# Altium footprint library SOURIAU THD.PcbLib: 34 footprints (part 1 of 5) (continued)
## SOURIAU_EDA-02399-V1-0 [mm] "Adapter Kit For PCB Mount For SOURIAU UTG0187SVDEX, 8 Poles,VDE  Metalok Bantam Circular Female Connecteur" (continued)
Mechanical 14:
  circle w0.1: c13.5,13.5 r2.8
  circle w0.1: c13.5,-13.5 r2.8
  circle w0.1: c-13.5,-13.5 r2.8
  circle w0.1: c-13.5,13.5 r2.8
  circle w0.1: c6.149,-3.55 r1.65
  circle w0.1: c6.149,3.55 r1.65
  circle w0.1: c0,-7.1 r1.65
  circle w0.1: c-6.149,-3.55 r1.65
  circle w0.1: c-6.149,3.55 r1.65
  circle w0.1: c0,7.1 r1.65
  circle w0.1: c0,0 r1.65
  circle w0.1: c0,0 r10.75
  circle w0.1: c0,0 r14.25
  lines w0.1: -14.39,-14.328 cw(c-14.47,-14.06) -14.662,-13.856 ccw(c-14.998,-13.5) -14.662,-13.144 cw(c-14.47,-12.94) -14.39,-12.672 ; -14.39,12.672 cw(c-14.47,12.94) -14.662,13.144 ccw(c-14.998,13.5) -14.662,13.856 cw(c-14.47,14.06) -14.39,14.328 ; -14.39,-14.328 cw(c-14.249,-14.798) -13.772,-14.685 ccw(c-13.5,-14.62) -13.228,-14.685 cw(c-12.751,-14.798) -12.61,-14.328 ccw(c-12.53,-14.06) -12.338,-13.856 cw(c-12.002,-13.5) -12.338,-13.144 ccw(c-12.53,-12.94) -12.61,-12.672 cw(c-12.751,-12.202) -13.228,-12.315 ccw(c-13.5,-12.38) -13.772,-12.315 cw(c-14.249,-12.202) -14.39,-12.672 ; -14.39,12.672 cw(c-14.249,12.202) -13.772,12.315 ccw(c-13.5,12.38) -13.228,12.315 cw(c-12.751,12.202) -12.61,12.672 ccw(c-12.53,12.94) -12.338,13.144 cw(c-12.002,13.5) -12.338,13.856 ccw(c-12.53,14.06) -12.61,14.328 cw(c-12.751,14.798) -13.228,14.685 ccw(c-13.5,14.62) -13.772,14.685 cw(c-14.249,14.798) -14.39,14.328 ; -12.81,6.241 -13.967,6.909 -12.967,8.641 -11.81,7.973 ; -1,-14.215 -1,-15.55 1,-15.55 1,-14.215 ; 11.81,7.973 12.967,8.641 13.967,6.909 12.81,6.241 ; -16.75,-14.75 ccw(c-14.75,-14.75) -14.75,-16.75 14.75,-16.75 ccw(c14.75,-14.75) 16.75,-14.75 16.75,14.75 ccw(c14.75,14.75) 14.75,16.75 -14.75,16.75 ccw(c-14.75,14.75) -16.75,14.75 -16.75,-14.75 ; -12.972,-2.699 ccw(c0,0) -12.584,-4.148 -11.616,-3.889 ccw(c0,0) -8.434,-8.884 -9.078,-9.652 ccw(c0,0) -7.929,-10.616 -7.285,-9.849 ccw(c0,0) 6.399,-10.446 6.973,-11.267 ccw(c0,0) 8.202,-10.406 7.627,-9.586 ccw(c0,0) 12.115,-1.813 13.113,-1.9 ccw(c0,0) 13.244,-0.406 12.246,-0.319 ccw(c0,0) 1.6,12.145 1.6,13.153 ccw(c0,0) -1.6,13.153 -1.6,12.145 ccw(c0,0) -12.005,-2.44 -12.972,-2.699 ; -9.406,-2.371 cw(c0,0) -9.406,2.371 -7.474,1.255 ccw(c-6.149,3.55) -4.824,5.845 -6.756,6.96 cw(c0,0) -2.65,9.331 -2.65,7.1 ccw(c0,7.1) 2.65,7.1 2.65,9.331 cw(c0,0) 6.756,6.96 4.824,5.845 ccw(c6.149,3.55) 7.474,1.255 9.406,2.371 cw(c0,0) 9.406,-2.371 7.474,-1.255 ccw(c6.149,-3.55) 4.824,-5.845 6.756,-6.96 cw(c0,0) 2.65,-9.331 2.65,-7.1 ccw(c0,-7.1) -2.65,-7.1 -2.65,-9.331 cw(c0,0) -6.756,-6.96 -4.824,-5.845 ccw(c-6.149,-3.55) -7.474,-1.255 -9.406,-2.371 ; 0.998,-2.292 ccw(c1.434,-2.048) 1.813,-1.722 ccw(c0,0) 0.998,-2.292 ; 12.338,-13.856 ccw(c12.53,-14.06) 12.61,-14.328 cw(c12.751,-14.798) 13.228,-14.685 ccw(c13.5,-14.62) 13.772,-14.685 cw(c14.249,-14.798) 14.39,-14.328 ccw(c14.47,-14.06) 14.662,-13.856 cw(c14.998,-13.5) 14.662,-13.144 ccw(c14.47,-12.94) 14.39,-12.672 cw(c14.249,-12.202) 13.772,-12.315 ccw(c13.5,-12.38) 13.228,-12.315 cw(c12.751,-12.202) 12.61,-12.672 ccw(c12.53,-12.94) 12.338,-13.144 cw(c12.002,-13.5) 12.338,-13.856 ; 12.338,13.144 ccw(c12.53,12.94) 12.61,12.672 cw(c12.751,12.202) 13.228,12.315 ccw(c13.5,12.38) 13.772,12.315 cw(c14.249,12.202) 14.39,12.672 ccw(c14.47,12.94) 14.662,13.144 cw(c14.998,13.5) 14.662,13.856 ccw(c14.47,14.06) 14.39,14.328 cw(c14.249,14.798) 13.772,14.685 ccw(c13.5,14.62) 13.228,14.685 cw(c12.751,14.798) 12.61,14.328 ccw(c12.53,14.06) 12.338,13.856 cw(c12.002,13.5) 12.338,13.144
  text "X" at -0.667,-8.1 h2
  text "X" at -0.667,6.1 h2
  text "X" at -0.667,-1 h2
  text "6" at 5.53,2.55 h2
  text "5" at 5.482,-4.55 h2
  text "3" at -6.815,-4.55 h2
  text "2" at -6.815,2.55 h2
3D body "SOURIAU_EDA-02399-V1-0.stp": height 40.3, standoff -5.89, extent -16.75,-16.75 16.75,16.75

## SOURIAU_EDA-02399-V1-1 [mm] "SOURIAU UTG0187SVDEX Adapter Kit For PCB Mount, 7 Poles, VDE  Metalok Bantam Circular Female Connecteur"
height 40.75
pads (11):
  round 1.9 hole 1.2: 1(0,7.1) 2(-6.149,3.55) 3(-6.149,-3.55) 4(0,-7.1) 5(6.149,-3.55) 6(6.149,3.55) 7(0,0)
  round 6.2 hole 3.2: MECH1(-13.5,13.5) MECH2(13.5,13.5) MECH3(-13.5,-13.5) MECH4(13.5,-13.5)
Top Overlay:
  circle w0.2: c0,0 r14.25
  circle w0.2: c6.149,-3.55 r1.65
  circle w0.2: c0,-7.1 r1.65
  circle w0.2: c-6.149,-3.55 r1.65
  circle w0.2: c0,0 r1.65
  circle w0.2: c-6.149,3.55 r1.65
  circle w0.2: c0,7.1 r1.65
  circle w0.2: c6.149,3.55 r1.65
  lines w0.2: -16.75,-11.594 -16.75,11.594 ; -12.81,6.241 -13.967,6.909 -12.967,8.641 -11.81,7.973 ; -11.594,-16.75 11.594,-16.75 ; -11.594,16.75 11.594,16.75 ; -10.037,3.85 ccw(c0,0) -9.956,-4.054 ; -8.406,-6.7 ccw(c0,0) -1.731,-10.61 ; -8.404,6.703 cw(c0,0) -0.922,10.71 ; -1,-14.215 -1,-15.55 1,-15.55 1,-14.215 ; 1.072,10.696 cw(c0,0) 8.277,6.859 ; 1.307,-10.67 ccw(c0,0) 8.829,-6.132 ; 9.98,3.996 cw(c0,0) 10.122,-3.62 ; 11.81,7.973 12.967,8.641 13.967,6.909 12.81,6.241 ; 16.75,-11.594 16.75,11.594 ; -12.972,-2.699 ccw(c0,0) -12.584,-4.148 -11.616,-3.889 ccw(c0,0) -8.434,-8.884 -9.078,-9.652 ccw(c0,0) -7.929,-10.616 -7.285,-9.849 ccw(c0,0) 6.399,-10.446 6.973,-11.267 ccw(c0,0) 8.202,-10.406 7.627,-9.586 ccw(c0,0) 12.115,-1.813 13.113,-1.9 ccw(c0,0) 13.244,-0.406 12.246,-0.319 ccw(c0,0) 1.6,12.145 1.6,13.153 ccw(c0,0) -1.6,13.153 -1.6,12.145 ccw(c0,0) -12.005,-2.44 -12.972,-2.699 ; -9.406,-2.371 cw(c0,0) -9.406,2.371 -7.474,1.255 ccw(c-6.149,3.55) -4.824,5.845 -6.756,6.96 cw(c0,0) -2.65,9.331 -2.65,7.1 ccw(c0,7.1) 2.65,7.1 2.65,9.331 cw(c0,0) 6.756,6.96 4.824,5.845 ccw(c6.149,3.55) 7.474,1.255 9.406,2.371 cw(c0,0) 9.406,-2.371 7.474,-1.255 ccw(c6.149,-3.55) 4.824,-5.845 6.756,-6.96 cw(c0,0) 2.65,-9.331 2.65,-7.1 ccw(c0,-7.1) -2.65,-7.1 -2.65,-9.331 cw(c0,0) -6.756,-6.96 -4.824,-5.845 ccw(c-6.149,-3.55) -7.474,-1.255 -9.406,-2.371 ; 0.998,-2.292 cw(c0,0) 1.813,-1.722 cw(c1.434,-2.048) 0.998,-2.292
  text "7" at 1.6,2.925 h1.2
  text "4" at -0.5,-10.9 h1.2
  text "1" at -0.15,9.225 h1.2
  text "2" at -9.325,4.525 h1.2
  text "3" at -9.375,-5.725 h1.2
  text "5" at 8.65,-5.35 h1.2
  text "6" at 8.1,4.725 h1.2
Mechanical 8:
  lines w0.1: -14,-13.5 -13.5,-13.5 ; -14,13.5 -13.5,13.5 ; -13.5,-14 -13.5,-13.5 ; -13.5,-13 -13.5,-13.5 ; -13.5,13 -13.5,13.5 ; -13.5,14 -13.5,13.5 ; -13,-13.5 -13.5,-13.5 ; -13,13.5 -13.5,13.5 ; -6.582,-3.8 -6.149,-3.55 ; -6.582,3.8 -6.149,3.55 ; -6.399,-3.117 -6.149,-3.55 ; -6.399,3.117 -6.149,3.55 ; -5.899,-3.983 -6.149,-3.55 ; -5.899,3.983 -6.149,3.55 ; -5.716,-3.3 -6.149,-3.55 ; -5.716,3.3 -6.149,3.55 ; -0.5,-7.1 0,-7.1 ; -0.5,0 0,0 ; -0.5,7.1 0,7.1 ; 0,-7.6 0,-7.1 ; 0,-6.6 0,-7.1 ; 0,-0.5 0,0 ; 0,0.5 0,0 ; 0,6.6 0,7.1 ; 0,7.6 0,7.1 ; 0.5,-7.1 0,-7.1 ; 0.5,0 0,0 ; 0.5,7.1 0,7.1 ; 5.716,-3.3 6.149,-3.55 ; 5.716,3.3 6.149,3.55 ; 5.899,-3.983 6.149,-3.55 ; 5.899,3.983 6.149,3.55 ; 6.399,-3.117 6.149,-3.55 ; 6.399,3.117 6.149,3.55 ; 6.582,-3.8 6.149,-3.55 ; 6.582,3.8 6.149,3.55 ; 13,-13.5 13.5,-13.5 ; 13,13.5 13.5,13.5 ; 13.5,-14 13.5,-13.5 ; 13.5,-13 13.5,-13.5 ; 13.5,13 13.5,13.5 ; 13.5,14 13.5,13.5 ; 14,-13.5 13.5,-13.5 ; 14,13.5 13.5,13.5
Mechanical 14:
  circle w0.1: c6.149,-3.55 r1.65
  circle w0.1: c6.149,3.55 r1.65
  circle w0.1: c0,-7.1 r1.65
  circle w0.1: c-6.149,-3.55 r1.65
  circle w0.1: c-6.149,3.55 r1.65
  circle w0.1: c0,7.1 r1.65
  circle w0.1: c0,0 r1.65
  circle w0.1: c0,0 r10.75
  circle w0.1: c0,0 r14.25
  circle w0.1: c13.5,13.5 r2.8
  circle w0.1: c-13.5,13.5 r2.8
  circle w0.1: c-13.5,-13.5 r2.8
  circle w0.1: c13.5,-13.5 r2.8
  lines w0.1: -14.39,-14.328 cw(c-14.47,-14.06) -14.662,-13.856 ccw(c-14.998,-13.5) -14.662,-13.144 cw(c-14.47,-12.94) -14.39,-12.672 ; -14.39,12.672 cw(c-14.47,12.94) -14.662,13.144 ccw(c-14.998,13.5) -14.662,13.856 cw(c-14.47,14.06) -14.39,14.328 ; -14.39,-14.328 cw(c-14.249,-14.798) -13.772,-14.685 ccw(c-13.5,-14.62) -13.228,-14.685 cw(c-12.751,-14.798) -12.61,-14.328 ccw(c-12.53,-14.06) -12.338,-13.856 cw(c-12.002,-13.5) -12.338,-13.144 ccw(c-12.53,-12.94) -12.61,-12.672 cw(c-12.751,-12.202) -13.228,-12.315 ccw(c-13.5,-12.38) -13.772,-12.315 cw(c-14.249,-12.202) -14.39,-12.672 ; -14.39,12.672 cw(c-14.249,12.202) -13.772,12.315 ccw(c-13.5,12.38) -13.228,12.315 cw(c-12.751,12.202) -12.61,12.672 ccw(c-12.53,12.94) -12.338,13.144 cw(c-12.002,13.5) -12.338,13.856 ccw(c-12.53,14.06) -12.61,14.328 cw(c-12.751,14.798) -13.228,14.685 ccw(c-13.5,14.62) -13.772,14.685 cw(c-14.249,14.798) -14.39,14.328 ; -12.81,6.241 -13.967,6.909 -12.967,8.641 -11.81,7.973 ; -1,-14.215 -1,-15.55 1,-15.55 1,-14.215 ; 11.81,7.973 12.967,8.641 13.967,6.909 12.81,6.241 ; -16.75,-14.75 ccw(c-14.75,-14.75) -14.75,-16.75 14.75,-16.75 ccw(c14.75,-14.75) 16.75,-14.75 16.75,14.75 ccw(c14.75,14.75) 14.75,16.75 -14.75,16.75 ccw(c-14.75,14.75) -16.75,14.75 -16.75,-14.75 ; -12.972,-2.699 ccw(c0,0) -12.584,-4.148 -11.616,-3.889 ccw(c0,0) -8.434,-8.884 -9.078,-9.652 ccw(c0,0) -7.929,-10.616 -7.285,-9.849 ccw(c0,0) 6.399,-10.446 6.973,-11.267 ccw(c0,0) 8.202,-10.406 7.627,-9.586 ccw(c0,0) 12.115,-1.813 13.113,-1.9 ccw(c0,0) 13.244,-0.406 12.246,-0.319 ccw(c0,0) 1.6,12.145 1.6,13.153 ccw(c0,0) -1.6,13.153 -1.6,12.145 ccw(c0,0) -12.005,-2.44 -12.972,-2.699 ; -9.406,-2.371 cw(c0,0) -9.406,2.371 -7.474,1.255 ccw(c-6.149,3.55) -4.824,5.845 -6.756,6.96 cw(c0,0) -2.65,9.331 -2.65,7.1 ccw(c0,7.1) 2.65,7.1 2.65,9.331 cw(c0,0) 6.756,6.96 4.824,5.845 ccw(c6.149,3.55) 7.474,1.255 9.406,2.371 cw(c0,0) 9.406,-2.371 7.474,-1.255 ccw(c6.149,-3.55) 4.824,-5.845 6.756,-6.96 cw(c0,0) 2.65,-9.331 2.65,-7.1 ccw(c0,-7.1) -2.65,-7.1 -2.65,-9.331 cw(c0,0) -6.756,-6.96 -4.824,-5.845 ccw(c-6.149,-3.55) -7.474,-1.255 -9.406,-2.371 ; 0.998,-2.292 ccw(c1.434,-2.048) 1.813,-1.722 ccw(c0,0) 0.998,-2.292 ; 12.338,-13.856 ccw(c12.002,-13.5) 12.338,-13.144 cw(c12.53,-12.94) 12.61,-12.672 ccw(c12.751,-12.202) 13.228,-12.315 cw(c13.5,-12.38) 13.772,-12.315 ccw(c14.249,-12.202) 14.39,-12.672 cw(c14.47,-12.94) 14.662,-13.144 ccw(c14.998,-13.5) 14.662,-13.856 cw(c14.47,-14.06) 14.39,-14.328 ccw(c14.249,-14.798) 13.772,-14.685 cw(c13.5,-14.62) 13.228,-14.685 ccw(c12.751,-14.798) 12.61,-14.328 cw(c12.53,-14.06) 12.338,-13.856 ; 12.338,13.144 ccw(c12.002,13.5) 12.338,13.856 cw(c12.53,14.06) 12.61,14.328 ccw(c12.751,14.798) 13.228,14.685 cw(c13.5,14.62) 13.772,14.685 ccw(c14.249,14.798) 14.39,14.328 cw(c14.47,14.06) 14.662,13.856 ccw(c14.998,13.5) 14.662,13.144 cw(c14.47,12.94) 14.39,12.672 ccw(c14.249,12.202) 13.772,12.315 cw(c13.5,12.38) 13.228,12.315 ccw(c12.751,12.202) 12.61,12.672 cw(c12.53,12.94) 12.338,13.144
  text "4" at -0.667,-8.1 h2
  text "1" at -0.35,6.125 h2
  text "7" at -0.667,-1 h2
  text "6" at 5.53,2.55 h2
  text "5" at 5.482,-4.55 h2
  text "3" at -6.815,-4.55 h2
  text "2" at -6.815,2.55 h2
3D body "SOURIAU_EDA-02399-V1-1.stp": height 40.3, standoff -5.89, extent -16.75,-16.75 16.75,16.75

## SOURIAU_EDA-02399-V1-2 [mm] "SOURIAU UTG0187SVDEX Adapter Kit For PCB Mount, 7 Poles, VDE  Metalok Bantam Circular Female Connecteur"
height 35.75
pads (11):
  round 1.9 hole 1.2: 1(0,7.1) 2(-6.149,3.55) 3(-6.149,-3.55) 4(0,-7.1) 5(6.149,-3.55) 6(6.149,3.55) 7(0,0)
  round 6.2 hole 3.2: MECH1(-13.5,13.5) MECH2(13.5,13.5) MECH3(-13.5,-13.5) MECH4(13.5,-13.5)
Top Overlay:
  circle w0.2: c6.149,3.55 r1.65
  circle w0.2: c0,7.1 r1.65
  circle w0.2: c-6.149,3.55 r1.65
  circle w0.2: c0,0 r1.65
  circle w0.2: c-6.149,-3.55 r1.65
  circle w0.2: c0,-7.1 r1.65
  circle w0.2: c6.149,-3.55 r1.65
  circle w0.2: c0,0 r14.25
  lines w0.2: -16.75,-11.594 -16.75,11.594 ; -12.81,6.241 -13.967,6.909 -12.967,8.641 -11.81,7.973 ; -11.594,-16.75 11.594,-16.75 ; -11.594,16.75 11.594,16.75 ; -10.037,3.85 ccw(c0,0) -9.956,-4.054 ; -8.406,-6.7 ccw(c0,0) -1.731,-10.61 ; -8.404,6.703 cw(c0,0) -0.922,10.71 ; -1,-14.215 -1,-15.55 1,-15.55 1,-14.215 ; 1.072,10.696 cw(c0,0) 8.277,6.859 ; 1.307,-10.67 ccw(c0,0) 8.829,-6.132 ; 9.98,3.996 cw(c0,0) 10.122,-3.62 ; 11.81,7.973 12.967,8.641 13.967,6.909 12.81,6.241 ; 16.75,-11.594 16.75,11.594 ; -12.972,-2.699 ccw(c0,0) -12.584,-4.148 -11.616,-3.889 ccw(c0,0) -8.434,-8.884 -9.078,-9.652 ccw(c0,0) -7.929,-10.616 -7.285,-9.849 ccw(c0,0) 6.399,-10.446 6.973,-11.267 ccw(c0,0) 8.202,-10.406 7.627,-9.586 ccw(c0,0) 12.115,-1.813 13.113,-1.9 ccw(c0,0) 13.244,-0.406 12.246,-0.319 ccw(c0,0) 1.6,12.145 1.6,13.153 ccw(c0,0) -1.6,13.153 -1.6,12.145 ccw(c0,0) -12.005,-2.44 -12.972,-2.699 ; -9.406,-2.371 cw(c0,0) -9.406,2.371 -7.474,1.255 ccw(c-6.149,3.55) -4.824,5.845 -6.756,6.96 cw(c0,0) -2.65,9.331 -2.65,7.1 ccw(c0,7.1) 2.65,7.1 2.65,9.331 cw(c0,0) 6.756,6.96 4.824,5.845 ccw(c6.149,3.55) 7.474,1.255 9.406,2.371 cw(c0,0) 9.406,-2.371 7.474,-1.255 ccw(c6.149,-3.55) 4.824,-5.845 6.756,-6.96 cw(c0,0) 2.65,-9.331 2.65,-7.1 ccw(c0,-7.1) -2.65,-7.1 -2.65,-9.331 cw(c0,0) -6.756,-6.96 -4.824,-5.845 ccw(c-6.149,-3.55) -7.474,-1.255 -9.406,-2.371 ; 0.998,-2.292 ccw(c1.434,-2.048) 1.813,-1.722 ccw(c0,0) 0.998,-2.292
  text "6" at 8.1,4.725 h1.2
  text "5" at 8.65,-5.35 h1.2
  text "3" at -9.375,-5.725 h1.2
  text "2" at -9.325,4.525 h1.2
  text "1" at -0.15,9.225 h1.2
  text "4" at -0.5,-10.9 h1.2
  text "7" at 1.6,2.925 h1.2
Mechanical 8:
  lines w0.1: -14,-13.5 -13.5,-13.5 ; -14,13.5 -13.5,13.5 ; -13.5,-14 -13.5,-13.5 ; -13.5,-13 -13.5,-13.5 ; -13.5,13 -13.5,13.5 ; -13.5,14 -13.5,13.5 ; -13,-13.5 -13.5,-13.5 ; -13,13.5 -13.5,13.5 ; -6.582,-3.8 -6.149,-3.55 ; -6.582,3.8 -6.149,3.55 ; -6.399,-3.117 -6.149,-3.55 ; -6.399,3.117 -6.149,3.55 ; -5.899,-3.983 -6.149,-3.55 ; -5.899,3.983 -6.149,3.55 ; -5.716,-3.3 -6.149,-3.55 ; -5.716,3.3 -6.149,3.55 ; -0.5,-7.1 0,-7.1 ; -0.5,0 0,0 ; -0.5,7.1 0,7.1 ; 0,-7.6 0,-7.1 ; 0,-6.6 0,-7.1 ; 0,-0.5 0,0 ; 0,0.5 0,0 ; 0,6.6 0,7.1 ; 0,7.6 0,7.1 ; 0.5,-7.1 0,-7.1 ; 0.5,0 0,0 ; 0.5,7.1 0,7.1 ; 5.716,-3.3 6.149,-3.55 ; 5.716,3.3 6.149,3.55 ; 5.899,-3.983 6.149,-3.55 ; 5.899,3.983 6.149,3.55 ; 6.399,-3.117 6.149,-3.55 ; 6.399,3.117 6.149,3.55 ; 6.582,-3.8 6.149,-3.55 ; 6.582,3.8 6.149,3.55 ; 13,-13.5 13.5,-13.5 ; 13,13.5 13.5,13.5 ; 13.5,-14 13.5,-13.5 ; 13.5,-13 13.5,-13.5 ; 13.5,13 13.5,13.5 ; 13.5,14 13.5,13.5 ; 14,-13.5 13.5,-13.5 ; 14,13.5 13.5,13.5
Mechanical 14:
  circle w0.1: c13.5,-13.5 r2.8
  circle w0.1: c-13.5,-13.5 r2.8
  circle w0.1: c-13.5,13.5 r2.8
  circle w0.1: c13.5,13.5 r2.8
  circle w0.1: c0,0 r14.25
  circle w0.1: c0,0 r10.75
  circle w0.1: c0,0 r1.65
  circle w0.1: c0,7.1 r1.65
  circle w0.1: c-6.149,3.55 r1.65
  circle w0.1: c-6.149,-3.55 r1.65
  circle w0.1: c0,-7.1 r1.65
  circle w0.1: c6.149,3.55 r1.65
  circle w0.1: c6.149,-3.55 r1.65
  lines w0.1: -14.39,-14.328 cw(c-14.47,-14.06) -14.662,-13.856 ccw(c-14.998,-13.5) -14.662,-13.144 cw(c-14.47,-12.94) -14.39,-12.672 ; -14.39,12.672 cw(c-14.47,12.94) -14.662,13.144 ccw(c-14.998,13.5) -14.662,13.856 cw(c-14.47,14.06) -14.39,14.328 ; -14.39,-14.328 cw(c-14.249,-14.798) -13.772,-14.685 ccw(c-13.5,-14.62) -13.228,-14.685 cw(c-12.751,-14.798) -12.61,-14.328 ccw(c-12.53,-14.06) -12.338,-13.856 cw(c-12.002,-13.5) -12.338,-13.144 ccw(c-12.53,-12.94) -12.61,-12.672 cw(c-12.751,-12.202) -13.228,-12.315 ccw(c-13.5,-12.38) -13.772,-12.315 cw(c-14.249,-12.202) -14.39,-12.672 ; -14.39,12.672 cw(c-14.249,12.202) -13.772,12.315 ccw(c-13.5,12.38) -13.228,12.315 cw(c-12.751,12.202) -12.61,12.672 ccw(c-12.53,12.94) -12.338,13.144 cw(c-12.002,13.5) -12.338,13.856 ccw(c-12.53,14.06) -12.61,14.328 cw(c-12.751,14.798) -13.228,14.685 ccw(c-13.5,14.62) -13.772,14.685 cw(c-14.249,14.798) -14.39,14.328 ; -12.81,6.241 -13.967,6.909 -12.967,8.641 -11.81,7.973 ; -1,-14.215 -1,-15.55 1,-15.55 1,-14.215 ; 11.81,7.973 12.967,8.641 13.967,6.909 12.81,6.241 ; -16.75,-14.75 ccw(c-14.75,-14.75) -14.75,-16.75 14.75,-16.75 ccw(c14.75,-14.75) 16.75,-14.75 16.75,14.75 ccw(c14.75,14.75) 14.75,16.75 -14.75,16.75 ccw(c-14.75,14.75) -16.75,14.75 -16.75,-14.75 ; -12.972,-2.699 ccw(c0,0) -12.584,-4.148 -11.616,-3.889 ccw(c0,0) -8.434,-8.884 -9.078,-9.652 ccw(c0,0) -7.929,-10.616 -7.285,-9.849 ccw(c0,0) 6.399,-10.446 6.973,-11.267 ccw(c0,0) 8.202,-10.406 7.627,-9.586 ccw(c0,0) 12.115,-1.813 13.113,-1.9 ccw(c0,0) 13.244,-0.406 12.246,-0.319 ccw(c0,0) 1.6,12.145 1.6,13.153 ccw(c0,0) -1.6,13.153 -1.6,12.145 ccw(c0,0) -12.005,-2.44 -12.972,-2.699 ; -9.406,-2.371 cw(c0,0) -9.406,2.371 -7.474,1.255 ccw(c-6.149,3.55) -4.824,5.845 -6.756,6.96 cw(c0,0) -2.65,9.331 -2.65,7.1 ccw(c0,7.1) 2.65,7.1 2.65,9.331 cw(c0,0) 6.756,6.96 4.824,5.845 ccw(c6.149,3.55) 7.474,1.255 9.406,2.371 cw(c0,0) 9.406,-2.371 7.474,-1.255 ccw(c6.149,-3.55) 4.824,-5.845 6.756,-6.96 cw(c0,0) 2.65,-9.331 2.65,-7.1 ccw(c0,-7.1) -2.65,-7.1 -2.65,-9.331 cw(c0,0) -6.756,-6.96 -4.824,-5.845 ccw(c-6.149,-3.55) -7.474,-1.255 -9.406,-2.371 ; 0.998,-2.292 cw(c0,0) 1.813,-1.722 cw(c1.434,-2.048) 0.998,-2.292 ; 12.338,-13.856 ccw(c12.53,-14.06) 12.61,-14.328 cw(c12.751,-14.798) 13.228,-14.685 ccw(c13.5,-14.62) 13.772,-14.685 cw(c14.249,-14.798) 14.39,-14.328 ccw(c14.47,-14.06) 14.662,-13.856 cw(c14.998,-13.5) 14.662,-13.144 ccw(c14.47,-12.94) 14.39,-12.672 cw(c14.249,-12.202) 13.772,-12.315 ccw(c13.5,-12.38) 13.228,-12.315 cw(c12.751,-12.202) 12.61,-12.672 ccw(c12.53,-12.94) 12.338,-13.144 cw(c12.002,-13.5) 12.338,-13.856 ; 12.338,13.144 ccw(c12.53,12.94) 12.61,12.672 cw(c12.751,12.202) 13.228,12.315 ccw(c13.5,12.38) 13.772,12.315 cw(c14.249,12.202) 14.39,12.672 ccw(c14.47,12.94) 14.662,13.144 cw(c14.998,13.5) 14.662,13.856 ccw(c14.47,14.06) 14.39,14.328 cw(c14.249,14.798) 13.772,14.685 ccw(c13.5,14.62) 13.228,14.685 cw(c12.751,14.798) 12.61,14.328 ccw(c12.53,14.06) 12.338,13.856 cw(c12.002,13.5) 12.338,13.144
  text "2" at -6.815,2.55 h2
  text "3" at -6.815,-4.55 h2
  text "5" at 5.482,-4.55 h2
  text "6" at 5.53,2.55 h2
  text "7" at -0.667,-1 h2
  text "1" at -0.35,6.125 h2
  text "4" at -0.667,-8.1 h2
3D body "SOURIAU_EDA-02399-V1-2.stp": height 35.3, standoff -10.4, extent -16.75,-16.75 16.75,16.75

## SOURIAU_EDA-02400-V1-0 [mm] "Adapter Kit For PCB Mount For SOURIAU UTG0128S03, 8 Poles, Shell Size 12, Metalok Bantam Circular Female Connecteur"
height 33.95
pads (12):
  round 1.9 hole 1.2: 1(0,0) 2(-4.45,0.9) 3(-3.45,-2.85) 4(0,-4.5) 5(3.45,-2.85) 6(4.45,0.9) 7(2,4) 8(-2,4)
  round 6.2 hole 3.2: MECH1(-10.3,10.3) MECH2(10.3,10.3) MECH3(-10.3,-10.3) MECH4(10.3,-10.3)
Top Overlay:
  circle w0.2: c0,0 r1.25
  circle w0.2: c-3.45,-2.85 r1.25
  circle w0.2: c0,-4.5 r1.25
  circle w0.2: c3.45,-2.85 r1.25
  circle w0.2: c4.45,0.9 r1.25
  circle w0.2: c2,4 r1.25
  circle w0.2: c-2,4 r1.25
  circle w0.2: c-4.45,0.9 r1.25
  circle w0.2: c0,0 r8.75
  circle w0.2: c0,0 r6.7
  circle w0.2: c0,0 r9.5
  circle w0.2: c0,0 r9.5
  lines w0.2: -13.1,-8.2 -13.1,8.2 ; -8.659,3.908 -10.432,4.932 -9.487,6.568 -7.714,5.545 ; -8.632,-1.433 -7.661,-1.173 cw(c0,0) -1.65,7.572 -1.65,8.593 ; -8.2,-13.1 8.2,-13.1 ; -8.2,13.1 8.2,13.1 ; -8.192,-3.075 -7.221,-2.815 ccw(c0,0) -5.603,-5.355 -6.249,-6.125 ; -4.947,-7.218 -4.3,-6.447 ccw(c0,0) 3.722,-6.798 4.299,-7.621 ; -4.128,-0.308 -3.772,-1.642 ; -3.225,0.652 -1.225,0.248 ; -2.322,-3.389 -1.128,-3.961 ; -0.945,-9.453 -0.945,-11.5 0.945,-11.5 0.945,-9.453 ; -0.75,4 0.75,4 ; 1.128,-3.961 2.322,-3.389 ; 1.65,8.593 1.65,7.572 cw(c0,0) 7.748,0.175 8.75,0.088 ; 2.775,3.019 3.675,1.881 ; 3.772,-1.642 4.128,-0.308 ; 5.691,-6.646 5.115,-5.823 ccw(c0,0) 7.6,-1.518 8.601,-1.606 ; 7.714,5.545 9.487,6.568 10.432,4.932 8.659,3.908 ; 13.1,-8.2 13.1,8.2
  text "8" at -4.567,3.068 h1.2
  text "2" at -6.12,-1.647 h1.2
  text "3" at -3.06,-5.606 h1.2
  text "6" at 4.334,2.523 h1.2
  text "5" at 4.976,-2.332 h1.2
  text "4" at 1.569,-5.883 h1.2
  text "7" at -0.083,5.001 h1.2
  text "1" at -0.243,1.685 h1.2
Mechanical 8:
  lines w0.1: -10.8,-10.3 -10.3,-10.3 ; -10.8,10.3 -10.3,10.3 ; -10.3,-10.8 -10.3,-10.3 ; -10.3,-9.8 -10.3,-10.3 ; -10.3,9.8 -10.3,10.3 ; -10.3,10.8 -10.3,10.3 ; -9.8,-10.3 -10.3,-10.3 ; -9.8,10.3 -10.3,10.3 ; -4.95,0.9 -4.45,0.9 ; -4.45,0.4 -4.45,0.9 ; -4.45,1.4 -4.45,0.9 ; -3.95,-2.85 -3.45,-2.85 ; -3.95,0.9 -4.45,0.9 ; -3.45,-3.35 -3.45,-2.85 ; -3.45,-2.35 -3.45,-2.85 ; -2.95,-2.85 -3.45,-2.85 ; -2.5,4 -2,4 ; -2,3.5 -2,4 ; -2,4.5 -2,4 ; -1.5,4 -2,4 ; -0.5,-4.5 0,-4.5 ; -0.5,0 0,0 ; 0,-5 0,-4.5 ; 0,-4 0,-4.5 ; 0,-0.5 0,0 ; 0,0.5 0,0 ; 0.5,-4.5 0,-4.5 ; 0.5,0 0,0 ; 1.5,4 2,4 ; 2,3.5 2,4 ; 2,4.5 2,4 ; 2.5,4 2,4 ; 2.95,-2.85 3.45,-2.85 ; 3.45,-3.35 3.45,-2.85 ; 3.45,-2.35 3.45,-2.85 ; 3.95,-2.85 3.45,-2.85 ; 3.95,0.9 4.45,0.9 ; 4.45,0.4 4.45,0.9 ; 4.45,1.4 4.45,0.9 ; 4.95,0.9 4.45,0.9 ; 9.8,-10.3 10.3,-10.3 ; 9.8,10.3 10.3,10.3 ; 10.3,-10.8 10.3,-10.3 ; 10.3,-9.8 10.3,-10.3 ; 10.3,9.8 10.3,10.3 ; 10.3,10.8 10.3,10.3 ; 10.8,-10.3 10.3,-10.3 ; 10.8,10.3 10.3,10.3
Mechanical 14:
  circle w0.1: c0,0 r1.25
  circle w0.1: c-3.45,-2.85 r1.25
  circle w0.1: c0,-4.5 r1.25
  circle w0.1: c3.45,-2.85 r1.25
  circle w0.1: c4.45,0.9 r1.25
  circle w0.1: c2,4 r1.25
  circle w0.1: c-2,4 r1.25
  circle w0.1: c-4.45,0.9 r1.25
  circle w0.1: c0,0 r8.75
  circle w0.1: c0,0 r6.7
  circle w0.1: c0,0 r9.5
  circle w0.1: c0,0 r9.5
  circle w0.1: c-10.3,10.3 r2.8
  circle w0.1: c10.3,10.3 r2.8
  circle w0.1: c10.3,-10.3 r2.8
  circle w0.1: c-10.3,-10.3 r2.8
  lines w0.1: -8.659,3.908 -10.432,4.932 -9.487,6.568 -7.714,5.545 ; -8.632,-1.433 -7.661,-1.173 cw(c0,0) -1.65,7.572 -1.65,8.593 ; -8.192,-3.075 -7.221,-2.815 ccw(c0,0) -5.603,-5.355 -6.249,-6.125 ; -4.947,-7.218 -4.3,-6.447 ccw(c0,0) 3.722,-6.798 4.299,-7.621 ; -4.128,-0.308 -3.772,-1.642 ; -3.225,0.652 -1.225,0.248 ; -2.322,-3.389 -1.128,-3.961 ; -0.945,-9.453 -0.945,-11.5 0.945,-11.5 0.945,-9.453 ; -0.75,4 0.75,4 ; 1.128,-3.961 2.322,-3.389 ; 1.65,8.593 1.65,7.572 cw(c0,0) 7.748,0.175 8.75,0.088 ; 2.775,3.019 3.675,1.881 ; 3.772,-1.642 4.128,-0.308 ; 5.691,-6.646 5.115,-5.823 ccw(c0,0) 7.6,-1.518 8.601,-1.606 ; 7.714,5.545 9.487,6.568 10.432,4.932 8.659,3.908 ; -13.1,-11.6 -13.1,11.6 -11.6,13.1 11.6,13.1 13.1,11.6 13.1,-11.6 11.6,-13.1 -11.6,-13.1 -13.1,-11.6 ; -11.462,-10.656 ccw(c-11.798,-10.3) -11.462,-9.944 cw(c-11.27,-9.74) -11.19,-9.472 ccw(c-11.049,-9.002) -10.572,-9.115 cw(c-10.3,-9.18) -10.028,-9.115 ccw(c-9.551,-9.002) -9.41,-9.472 cw(c-9.33,-9.74) -9.138,-9.944 ccw(c-8.802,-10.3) -9.138,-10.656 cw(c-9.33,-10.86) -9.41,-11.128 ccw(c-9.551,-11.598) -10.028,-11.485 cw(c-10.3,-11.42) -10.572,-11.485 ccw(c-11.049,-11.598) -11.19,-11.128 cw(c-11.27,-10.86) -11.462,-10.656 ; -11.462,9.944 ccw(c-11.798,10.3) -11.462,10.656 cw(c-11.27,10.86) -11.19,11.128 ccw(c-11.049,11.598) -10.572,11.485 cw(c-10.3,11.42) -10.028,11.485 ccw(c-9.551,11.598) -9.41,11.128 cw(c-9.33,10.86) -9.138,10.656 ccw(c-8.802,10.3) -9.138,9.944 cw(c-9.33,9.74) -9.41,9.472 ccw(c-9.551,9.002) -10.028,9.115 cw(c-10.3,9.18) -10.572,9.115 ccw(c-11.049,9.002) -11.19,9.472 cw(c-11.27,9.74) -11.462,9.944 ; 9.138,-10.656 ccw(c8.802,-10.3) 9.138,-9.944 cw(c9.33,-9.74) 9.41,-9.472 ccw(c9.551,-9.002) 10.028,-9.115 cw(c10.3,-9.18) 10.572,-9.115 ccw(c11.049,-9.002) 11.19,-9.472 cw(c11.27,-9.74) 11.462,-9.944 ccw(c11.798,-10.3) 11.462,-10.656 cw(c11.27,-10.86) 11.19,-11.128 ccw(c11.049,-11.598) 10.572,-11.485 cw(c10.3,-11.42) 10.028,-11.485 ccw(c9.551,-11.598) 9.41,-11.128 cw(c9.33,-10.86) 9.138,-10.656 ; 9.138,9.944 ccw(c8.802,10.3) 9.138,10.656 cw(c9.33,10.86) 9.41,11.128 ccw(c9.551,11.598) 10.028,11.485 cw(c10.3,11.42) 10.572,11.485 ccw(c11.049,11.598) 11.19,11.128 cw(c11.27,10.86) 11.462,10.656 ccw(c11.798,10.3) 11.462,9.944 cw(c11.27,9.74) 11.19,9.472 ccw(c11.049,9.002) 10.572,9.115 cw(c10.3,9.18) 10.028,9.115 ccw(c9.551,9.002) 9.41,9.472 cw(c9.33,9.74) 9.138,9.944
  text "8" at -4.567,3.068 h1.2
  text "2" at -6.12,-1.647 h1.2
  text "3" at -3.06,-5.606 h1.2
  text "6" at 4.334,2.523 h1.2
  text "5" at 4.976,-2.332 h1.2
  text "4" at 1.569,-5.883 h1.2
  text "7" at -0.083,5.001 h1.2
  text "1" at -0.243,1.685 h1.2
3D body "SOURIAU_EDA-02400-V1-0.stp": height 33.7, standoff -6.3, extent -13.4,-13.4 13.399,13.394